# Altium footprint library Inductors SMD.PcbLib: 145 footprints (part 2 of 10)
Each footprint in its own frame and in the unit in brackets; x right, y up, seen from the top. Pads: shape width x height; smd on the part's side, far side on the other; paste and mask are expansions set on the pad; w line width, h text height; cw(c..) or ccw(c..) is an arc to the next point about the centre after c.
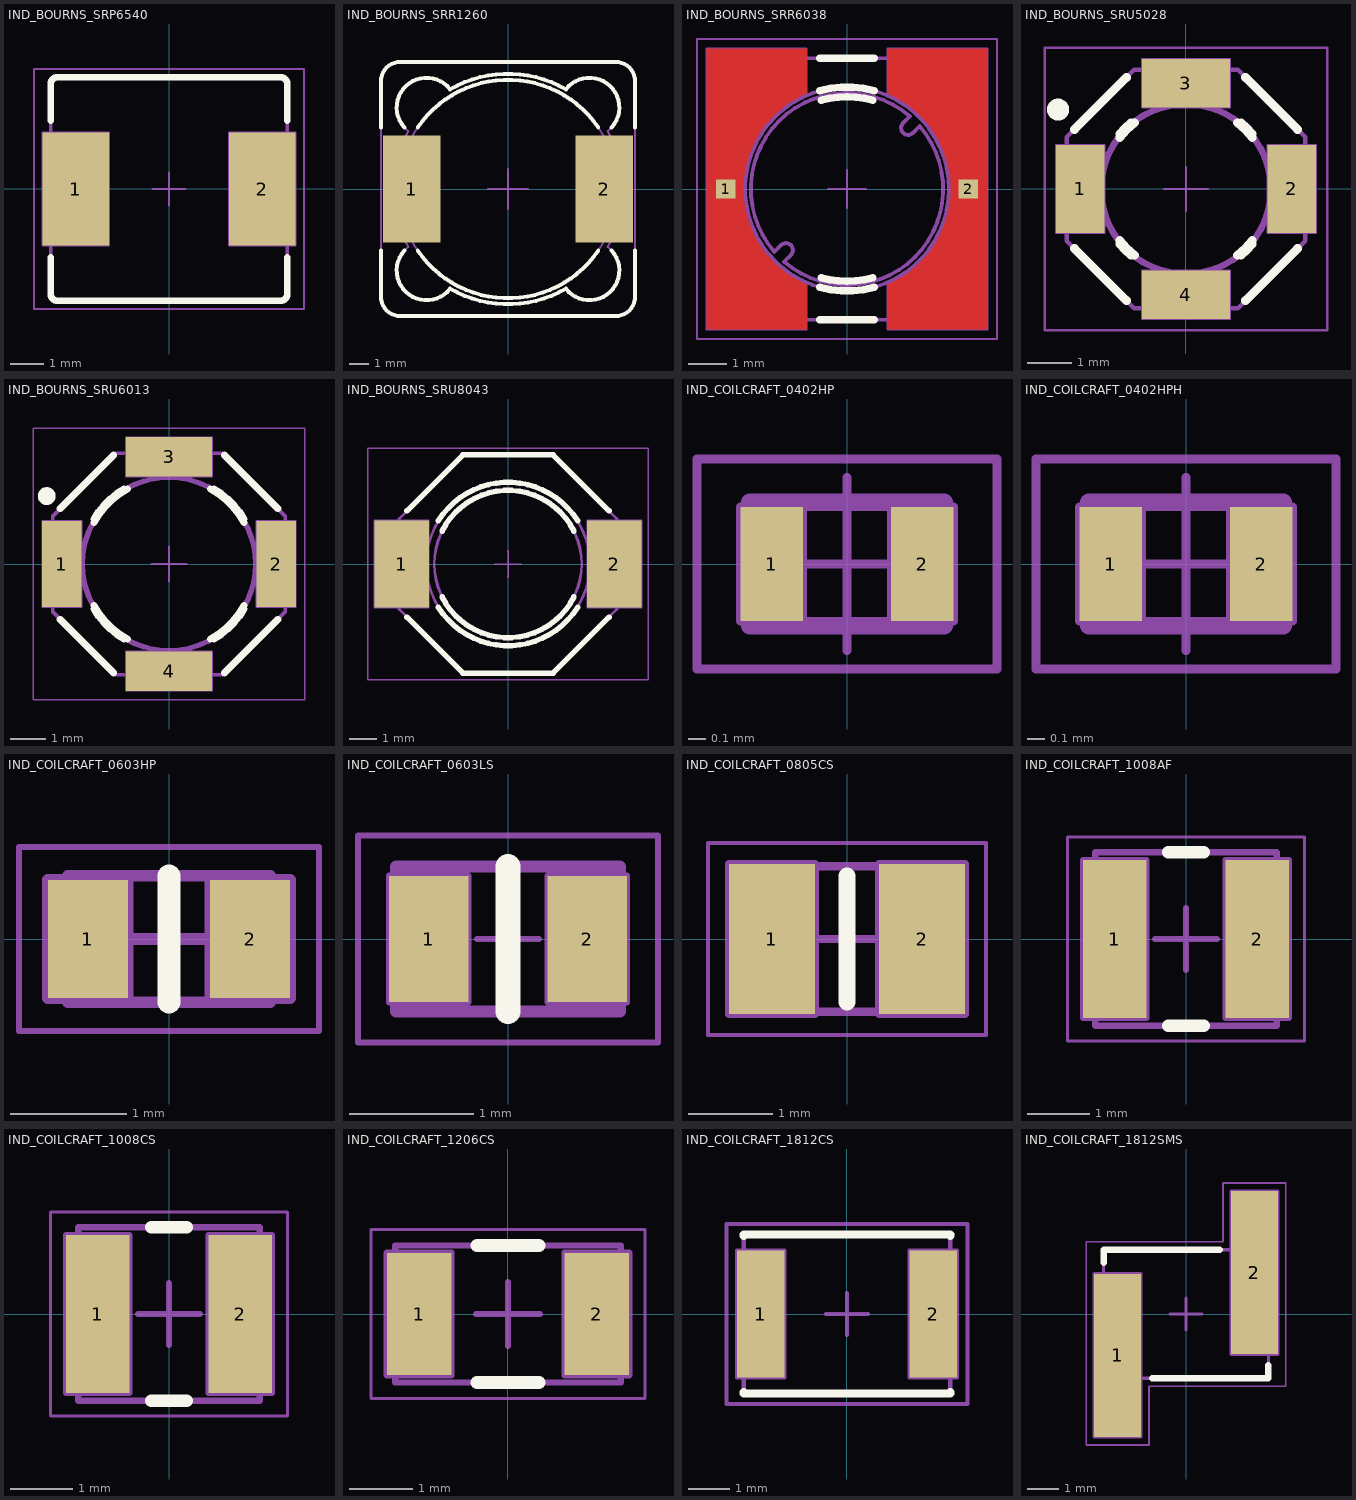
[diagram p1: the footprints below, top view; thin cyan lines are the x and y axes]

## IND_BOURNS_SRP6540 [mm] "SMD Inductor Body Width 7.5mm Body Lenght 6.7mm Height 4mm"
height 4
pads (2):
  rect 2x3.4 smd: 1(-2.8,0) 2(2.8,0)
Top Overlay:
  lines w0.2: -3.55,-2.05 -3.55,-3.15 ccw(c-3.35,-3.15) -3.35,-3.35 3.35,-3.35 ccw(c3.35,-3.15) 3.55,-3.15 3.55,-2.05 ; -3.55,2.05 -3.55,3.15 cw(c-3.35,3.15) -3.35,3.35 3.35,3.35 cw(c3.35,3.15) 3.55,3.15 3.55,2.05
Mechanical 8:
  lines w0.05: -3.3,0 -2.8,0 ; -2.8,-0.5 -2.8,0 ; -2.8,0.5 -2.8,0 ; -2.3,0 -2.8,0 ; -0.5,0 0,0 ; 0,-0.5 0,0 ; 0,0.5 0,0 ; 0.5,0 0,0 ; 2.3,0 2.8,0 ; 2.8,-0.5 2.8,0 ; 2.8,0.5 2.8,0 ; 3.3,0 2.8,0 ; -3.8,-1.7 -1.8,-1.7 -1.8,1.7 -3.8,1.7 -3.8,-1.7 ; 1.8,-1.7 3.8,-1.7 3.8,1.7 1.8,1.7 1.8,-1.7
Mechanical 14:
  lines w0.1: -3.55,-1.65 -3.75,-1.65 -3.75,1.65 -3.55,1.65 ; 3.55,-1.65 3.75,-1.65 3.75,1.65 3.55,1.65 ; -3.55,-3.15 ccw(c-3.35,-3.15) -3.35,-3.35 3.35,-3.35 ccw(c3.35,-3.15) 3.55,-3.15 3.55,3.15 ccw(c3.35,3.15) 3.35,3.35 -3.35,3.35 ccw(c-3.35,3.15) -3.55,3.15 -3.55,-3.15
Mechanical 15:
  lines w0.05: -4.05,-3.6 -4.05,3.6 4.05,3.6 4.05,-3.6 -4.05,-3.6
3D body "IND_BOURNS_SRP6540.stp": height 4, standoff 0, extent -3.75,-3.35 3.75,3.35

## IND_BOURNS_SRR1260 [mm] "SMD Inductor Body Width 12.5mm Body Lenght 12.5mm Height 6.5mm"
height 6.5
pads (2):
  rect 2.9x5.4 smd: 1(-4.85,0) 2(4.85,0)
Top Overlay:
  lines w0.2: -6.4,-3.1 -6.4,-5.4 ccw(c-5.4,-5.4) -5.4,-6.4 5.4,-6.4 ccw(c5.4,-5.4) 6.4,-5.4 6.4,-3.1 ; -6.4,3.1 -6.4,5.4 cw(c-5.4,5.4) -5.4,6.4 5.4,6.4 cw(c5.4,5.4) 6.4,5.4 6.4,3.1 ; -5.218,-3.1 ccw(c-4.101,-4.101) -2.912,-5.016 ccw(c0,0) 2.912,-5.016 ccw(c4.101,-4.101) 5.218,-3.1 ; -5.218,3.1 cw(c-4.101,4.101) -2.912,5.016 cw(c0,0) 2.912,5.016 cw(c4.101,4.101) 5.218,3.1 ; -4.543,-3.1 ccw(c0,0) 4.543,-3.1 ; -4.543,3.1 cw(c0,0) 4.543,3.1
Mechanical 8:
  lines w0.1: -5.85,0 -4.85,0 ; -4.85,-1 -4.85,0 ; -4.85,1 -4.85,0 ; -3.85,0 -4.85,0 ; -1,0 0,0 ; 0,-1 0,0 ; 0,1 0,0 ; 1,0 0,0 ; 3.85,0 4.85,0 ; 4.85,-1 4.85,0 ; 4.85,1 4.85,0 ; 5.85,0 4.85,0
Mechanical 14:
  circle w0.1: c0,0 r5.5
  lines w0.1: -6.4,-5.4 ccw(c-5.4,-5.4) -5.4,-6.4 5.4,-6.4 ccw(c5.4,-5.4) 6.4,-5.4 6.4,5.4 ccw(c5.4,5.4) 5.4,6.4 -5.4,6.4 ccw(c-5.4,5.4) -6.4,5.4 -6.4,-5.4 ; -5.016,-2.912 ccw(c-4.101,-4.101) -2.912,-5.016 ccw(c0,0) 2.912,-5.016 ccw(c4.101,-4.101) 5.016,-2.912 ccw(c0,0) 5.016,2.912 ccw(c4.101,4.101) 2.912,5.016 ccw(c0,0) -2.912,5.016 ccw(c-4.101,4.101) -5.016,2.912 ccw(c0,0) -5.016,-2.912
3D body "IND_BOURNS_SRR1260.stp": height 6.5, standoff 0, extent -6.4,-6.4 6.4,6.4

## IND_BOURNS_SRR6038 [mm] "SMD Inductor Body Width 7mm Body Lenght 7mm Height 4mm"
height 4
pads (2):
  rect 0.5x0.5 smd: 1(-3.15,0) 2(3.15,0)
Top Layer:
  region: 1.05,-3.65 3.65,-3.65 3.65,3.65 1.05,3.65 1.05,2.487 1.229,2.404 1.567,2.199 1.871,1.947 2.135,1.653 2.353,1.324 2.521,0.966 2.635,0.588 2.693,0.197 2.693,-0.197 2.635,-0.588 2.521,-0.966 2.353,-1.324 2.135,-1.653 1.871,-1.947 1.567,-2.199 1.229,-2.404 1.05,-2.487
  region: -3.65,-3.65 -3.65,3.65 -1.05,3.65 -1.05,2.487 -1.229,2.404 -1.567,2.199 -1.871,1.947 -2.135,1.653 -2.353,1.324 -2.521,0.966 -2.635,0.588 -2.693,0.197 -2.693,-0.197 -2.635,-0.588 -2.521,-0.966 -2.353,-1.324 -2.135,-1.653 -1.871,-1.947 -1.567,-2.199 -1.229,-2.404 -1.05,-2.487 -1.05,-3.65
Top Overlay:
  lines w0.2: -0.7,-3.4 0.7,-3.4 ; -0.7,-2.556 ccw(c0,0) 0.7,-2.556 ; -0.7,2.556 cw(c0,0) 0.7,2.556 ; -0.7,3.4 0.7,3.4 ; -0.672,-2.304 ccw(c0,0) 0.672,-2.304 ; -0.672,2.304 cw(c0,0) 0.672,2.304
Mechanical 8:
  lines w0.05: -3.15,-0.5 -3.15,0 ; -3.15,0.5 -3.15,0 ; -2.65,0 -3.15,0 ; -0.5,0 0,0 ; 0,-0.5 0,0 ; 0,0.5 0,0 ; 0.5,0 0,0 ; 2.65,0 3.15,0 ; 3.15,-0.5 3.15,0 ; 3.15,0.5 3.15,0 ; -3.65,-3.65 -1.05,-3.65 -1.05,-2.487 cw(c0,0) -1.05,2.487 -1.05,3.65 -3.65,3.65 -3.65,-3.65 ; 1.05,-3.65 1.05,-2.487 ccw(c0,0) 1.05,2.487 1.05,3.65 3.65,3.65 3.65,-3.65 1.05,-3.65
Mechanical 14:
  circle w0.1: c0,0 r2.65
  lines w0.1: -3.4,-3.35 ccw(c-3.35,-3.35) -3.35,-3.4 3.35,-3.4 ccw(c3.35,-3.35) 3.4,-3.35 3.4,3.35 ccw(c3.35,3.35) 3.35,3.4 -3.35,3.4 ccw(c-3.35,3.35) -3.4,3.35 -3.4,-3.35 ; -1.89,-1.636 cw(c0,0) 1.636,1.89 1.459,1.714 ccw(c1.586,1.586) 1.714,1.459 1.89,1.636 cw(c0,0) -1.636,-1.89 -1.459,-1.714 ccw(c-1.586,-1.586) -1.714,-1.459 -1.89,-1.636
Mechanical 15:
  lines w0.05: -3.9,-3.9 -3.9,3.9 3.9,3.9 3.9,-3.9 -3.9,-3.9
3D body "IND_BOURNS_SRR6038.stp": height 3.8, standoff 0, extent -3.4,-3.4 3.4,3.4

## IND_BOURNS_SRU5028 [mm] "SMD Inductor Body Width 5.4mm Body Lenght 5.4mm Height 3mm"
height 3
pads (4):
  rect 1.1x2 smd: 1(-2.4,0) 2(2.4,0)
  rect 2x1.1 smd: 3(0,2.4) 4(0,-2.4)
Top Overlay:
  circle w0.25: c-2.9,1.8 r0.125
  lines w0.2: -2.527,-1.35 -1.35,-2.527 ; -2.527,1.35 -1.35,2.527 ; -1.5,-1.246 ccw(c0,0) -1.246,-1.5 ; -1.5,-1.166 ccw(c0,0) -1.166,-1.5 ; -1.5,1.166 cw(c0,0) -1.166,1.5 ; -1.5,1.246 cw(c0,0) -1.246,1.5 ; 1.166,-1.5 ccw(c0,0) 1.5,-1.166 ; 1.166,1.5 cw(c0,0) 1.5,1.166 ; 1.246,-1.5 ccw(c0,0) 1.5,-1.246 ; 1.246,1.5 cw(c0,0) 1.5,1.246 ; 1.35,-2.527 2.527,-1.35 ; 1.35,2.527 2.527,1.35
Mechanical 8:
  lines w0.05: -2.9,0 -2.4,0 ; -2.4,-0.5 -2.4,0 ; -2.4,0.5 -2.4,0 ; -1.9,0 -2.4,0 ; -0.5,-2.4 0,-2.4 ; -0.5,0 0,0 ; -0.5,2.4 0,2.4 ; 0,-2.9 0,-2.4 ; 0,-1.9 0,-2.4 ; 0,-0.5 0,0 ; 0,0.5 0,0 ; 0,1.9 0,2.4 ; 0,2.9 0,2.4 ; 0.5,-2.4 0,-2.4 ; 0.5,0 0,0 ; 0.5,2.4 0,2.4 ; 1.9,0 2.4,0 ; 2.4,-0.5 2.4,0 ; 2.4,0.5 2.4,0 ; 2.9,0 2.4,0 ; -2.95,-1 -2.95,1 -1.85,1 -1.85,-1 -2.95,-1 ; -1,-2.95 1,-2.95 1,-1.85 -1,-1.85 -1,-2.95 ; -1,1.85 1,1.85 1,2.95 -1,2.95 -1,1.85 ; 1.85,-1 1.85,1 2.95,1 2.95,-1 1.85,-1
Mechanical 14:
  circle w0.1: c0,0 r1.9
  circle w0.1: c0,0 r1.95
  lines w0.1: -2.7,-1.177 -2.7,1.177 -1.177,2.7 1.177,2.7 2.7,1.177 2.7,-1.177 1.177,-2.7 -1.177,-2.7 -2.7,-1.177
Mechanical 15:
  lines w0.05: -3.2,-3.2 3.2,-3.2 3.2,3.2 -3.2,3.2 -3.2,-3.2
3D body "IND_BOURNS_SRU5028.stp": height 2.8, standoff 0, extent -2.7,-2.7 2.7,2.7

## IND_BOURNS_SRU6013 [mm] "SMD Inductor Body Width 6.5mm Body Lenght 6.5mm Height 1.6mm"
height 1.6
pads (4):
  rect 1.1x2.4 smd: 1(-3,0) 2(3,0)
  rect 2.4x1.1 smd: 3(0,3) 4(0,-3)
Top Overlay:
  circle w0.25: c-3.425,1.9 r0.125
  lines w0.2: -3.046,-1.55 -1.55,-3.046 ; -3.046,1.55 -1.55,3.046 ; -2.1,-1.262 ccw(c0,0) -1.262,-2.1 ; -2.1,-1.162 ccw(c0,0) -1.162,-2.1 ; -2.1,1.162 cw(c0,0) -1.162,2.1 ; -2.1,1.262 cw(c0,0) -1.262,2.1 ; 1.162,-2.1 ccw(c0,0) 2.1,-1.162 ; 1.162,2.1 cw(c0,0) 2.1,1.162 ; 1.262,-2.1 ccw(c0,0) 2.1,-1.262 ; 1.262,2.1 cw(c0,0) 2.1,1.262 ; 1.55,-3.046 3.046,-1.55 ; 1.55,3.046 3.046,1.55
Mechanical 8:
  lines w0.05: -3.5,0 -3,0 ; -3,-0.5 -3,0 ; -3,0.5 -3,0 ; -2.5,0 -3,0 ; -0.5,-3 0,-3 ; -0.5,0 0,0 ; -0.5,3 0,3 ; 0,-3.5 0,-3 ; 0,-2.5 0,-3 ; 0,-0.5 0,0 ; 0,0.5 0,0 ; 0,2.5 0,3 ; 0,3.5 0,3 ; 0.5,-3 0,-3 ; 0.5,0 0,0 ; 0.5,3 0,3 ; 2.5,0 3,0 ; 3,-0.5 3,0 ; 3,0.5 3,0 ; 3.5,0 3,0 ; -3.55,-1.2 -2.45,-1.2 -2.45,1.2 -3.55,1.2 -3.55,-1.2 ; -1.2,-3.55 -1.2,-2.45 1.2,-2.45 1.2,-3.55 -1.2,-3.55 ; -1.2,2.45 1.2,2.45 1.2,3.55 -1.2,3.55 -1.2,2.45 ; 2.45,-1.2 2.45,1.2 3.55,1.2 3.55,-1.2 2.45,-1.2
Mechanical 14:
  circle w0.1: c0,0 r2.4
  circle w0.1: c0,0 r2.45
  lines w0.1: -3.25,-1.346 -1.496,-3.1 1.496,-3.1 3.25,-1.346 3.25,1.346 1.496,3.1 -1.496,3.1 -3.25,1.346 -3.25,-1.346
Mechanical 15:
  lines w0.05: -3.8,-3.8 3.8,-3.8 3.8,3.8 -3.8,3.8 -3.8,-3.8
3D body "IND_BOURNS_SRU6013.stp": height 1.6, standoff 0, extent -3.25,-3.1 3.25,3.1

## IND_BOURNS_SRU8043 [mm] "SMD Inductor Body Width 8.3mm Body Lenght 8.3mm Height 4.6mm"
height 4.6
pads (2):
  rect 2x3.2 smd: 1(-3.9,0) 2(3.9,0)
Top Overlay:
  lines w0.2: -3.707,-1.95 -1.657,-4 1.657,-4 3.707,-1.95 ; -3.707,1.95 -1.657,4 1.657,4 3.707,1.95 ; -2.55,-1.58 ccw(c0,0) 2.55,-1.58 ; -2.55,1.58 cw(c0,0) 2.55,1.58 ; -2.416,-1.206 ccw(c0,0) 2.416,-1.206 ; -2.416,1.206 cw(c0,0) 2.416,1.206
Mechanical 8:
  lines w0.05: -4.4,0 -3.9,0 ; -3.9,-0.5 -3.9,0 ; -3.9,0.5 -3.9,0 ; -3.4,0 -3.9,0 ; -0.5,0 0,0 ; 0,-0.5 0,0 ; 0,0.5 0,0 ; 0.5,0 0,0 ; 3.4,0 3.9,0 ; 3.9,-0.5 3.9,0 ; 3.9,0.5 3.9,0 ; 4.4,0 3.9,0 ; -4.9,-1.6 -4.9,1.6 -2.9,1.6 -2.9,-1.6 -4.9,-1.6 ; 2.9,-1.6 2.9,1.6 4.9,1.6 4.9,-1.6 2.9,-1.6
Mechanical 14:
  circle w0.1: c0,0 r3
  circle w0.1: c0,0 r2.7
  lines w0.1: -4,-1.657 -4,1.657 -1.657,4 1.657,4 4,1.657 4,-1.657 1.657,-4 -1.657,-4 -4,-1.657
Mechanical 15:
  lines w0.05: -5.15,-4.25 -5.15,4.25 5.15,4.25 5.15,-4.25 -5.15,-4.25
3D body "IND_BOURNS_SRU8043.stp": height 4.3, standoff 0, extent -4,-4 4,4

## IND_COILCRAFT_0402HP [mm] "Chip Inductor, Body Width 0.71mm Body Lenght 1.09mm Height 0.61mm"
height 0.61
pads (2):
  rect 0.36x0.66 smd: 1(-0.435,0) 2(0.435,0)
Mechanical 8:
  lines w0.05: -0.5,0 0,0 ; 0,-0.5 0,0 ; 0,0.5 0,0 ; 0.255,0 0,0 ; 0.5,0 0,0 ; -0.615,0.33 -0.435,0 -0.255,0.33 ; -0.615,0.33 -0.255,0.33 ; -0.615,0.33 -0.615,-0.33 -0.255,-0.33 -0.255,0.33 ; 0.255,0.33 0.435,0 0.615,0.33 ; 0.255,0.33 0.255,-0.33 0.615,-0.33 0.615,0.33 ; 0.255,0.33 0.615,0.33
Mechanical 14:
  lines w0.1: -0.56,-0.356 0.56,-0.356 0.56,0.356 -0.56,0.356 -0.56,-0.356
Mechanical 15:
  lines w0.05: -0.865,-0.606 -0.865,0.606 0.865,0.606 0.865,-0.606 -0.865,-0.606
3D body "IND_COILCRAFT_0402HP.stp": height 0.61, standoff 0, extent -0.548,-0.355 0.548,0.356

## IND_COILCRAFT_0402HPH [mm] "Chip Inductor, Body Width 0.71mm Body Lenght 1.12mm Height 0.66mm"
height 0.66
pads (2):
  rect 0.36x0.66 smd: 1(-0.435,0) 2(0.435,0)
Mechanical 8:
  lines w0.05: -0.5,0 0,0 ; 0,-0.5 0,0 ; 0,0.5 0,0 ; 0.255,0 0,0 ; 0.5,0 0,0 ; -0.615,0.33 -0.615,-0.33 -0.255,-0.33 -0.255,0.33 ; -0.615,0.33 -0.255,0.33 ; -0.615,0.33 -0.435,0 -0.255,0.33 ; 0.255,0.33 0.615,0.33 ; 0.255,0.33 0.255,-0.33 0.615,-0.33 0.615,0.33 ; 0.255,0.33 0.435,0 0.615,0.33
Mechanical 14:
  lines w0.1: -0.56,-0.356 -0.56,0.356 0.56,0.356 0.56,-0.356 -0.56,-0.356
Mechanical 15:
  lines w0.05: -0.865,-0.606 0.865,-0.606 0.865,0.606 -0.865,0.606 -0.865,-0.606
3D body "IND_COILCRAFT_0402HPH.stp": height 0.66, standoff 0, extent -0.56,-0.355 0.56,0.356

## IND_COILCRAFT_0603HP [mm] "Chip Inductor, Body Width 1.09mm Body Lenght 1.75mm Height 0.94mm"
height 0.94
pads (2):
  rect 0.69x1.02 smd: 1(-0.7,0) 2(0.7,0)
Top Overlay:
  lines w0.2: 0,-0.545 0,0.545
Mechanical 8:
  lines w0.1: -0.5,0 0,0 ; 0,-0.5 0,0 ; 0,0.5 0,0 ; 0.5,0 0,0 ; -1.045,-0.51 -1.045,0.51 ; -1.045,-0.51 -0.355,-0.51 -0.355,0.51 -1.045,0.51 ; -1.045,-0.51 -0.7,0 -1.045,0.51 ; 1.045,-0.51 0.355,-0.51 0.355,0.51 1.045,0.51 ; 1.045,-0.51 1.045,0.51 ; 1.045,-0.51 0.7,0 1.045,0.51
Mechanical 14:
  lines w0.1: -0.875,-0.545 0.875,-0.545 0.875,0.545 -0.875,0.545 -0.875,-0.545
Mechanical 15:
  lines w0.05: -1.295,-0.795 1.295,-0.795 1.295,0.795 -1.295,0.795 -1.295,-0.795
3D body "IND_COILCRAFT_0603HP.stp": height 0.93, standoff -0.01, extent -0.875,-0.545 0.875,0.545

## IND_COILCRAFT_0603LS [mm] "SMD Inductor  Body Width 1.27mm Body Lenght 1.8mm Height 1.12mm, 0603LS Series"
height 1.12
pads (2):
  rect 0.64x1.02 smd: 1(-0.64,0) 2(0.64,0)
Top Overlay:
  lines w0.2: 0,-0.584 0,0.584
Mechanical 8:
  lines w0.05: -0.64,-0.51 -0.64,0 -0.32,0 ; -0.25,0 0,0 ; 0,-0.25 0,0 ; 0,0.25 0,0 ; 0.25,0 0,0 ; 0.64,-0.51 0.64,0 0.96,0 ; -0.96,-0.51 -0.32,-0.51 -0.32,0.51 -0.96,0.51 -0.96,-0.51 ; 0.32,-0.51 0.96,-0.51 0.96,0.51 0.32,0.51 0.32,-0.51
Mechanical 14:
  circle w0.1: c-0.636,0 r0.07
  lines w0.1: -0.901,-0.584 -0.901,0.584 0.901,0.584 0.901,-0.584 -0.901,-0.584
Mechanical 15:
  lines w0.05: -1.21,-0.834 1.21,-0.834 1.21,0.834 -1.21,0.834 -1.21,-0.834
3D body "IND_15UH_5%_COILCRAFT_0603LS.stp": height 1.12, standoff 0, extent -0.901,-0.584 0.901,0.585

## IND_COILCRAFT_0805CS [mm] "SMD Inductor  Body Width 1.73mm Body Lenght 2.29mm Height 1.52mm, 0805CS Series"
height 1.52
pads (2):
  rect 1.02x1.78 smd: 1(-0.89,0) 2(0.89,0)
Top Overlay:
  lines w0.2: 0,-0.75 0,0.75
Mechanical 8:
  lines w0.1: -1.39,0 -0.89,0 ; -0.89,-0.5 -0.89,0 ; -0.89,0.5 -0.89,0 ; -0.5,0 0,0 ; -0.39,0 -0.89,0 ; 0,-0.5 0,0 ; 0,0.5 0,0 ; 0.39,0 0.89,0 ; 0.5,0 0,0 ; 0.89,-0.5 0.89,0 ; 0.89,0.5 0.89,0 ; 1.39,0 0.89,0 ; -1.4,-0.89 -1.4,0.89 -0.38,0.89 -0.38,-0.89 -1.4,-0.89 ; 0.38,-0.89 0.38,0.89 1.4,0.89 1.4,-0.89 0.38,-0.89
Mechanical 14:
  lines w0.1: -1.145,-0.863 1.145,-0.863 1.145,0.863 -1.145,0.863 -1.145,-0.863
Mechanical 15:
  lines w0.05: -1.65,-1.14 -1.65,1.14 1.65,1.14 1.65,-1.14 -1.65,-1.14
3D body "IND_COILCRAFT_0805CS.stp": height 1.52, standoff 0, extent -1.144,-0.862 1.145,0.863

## IND_COILCRAFT_1008AF [mm] "SMD Inductor Body Width 2.79m Body Lenght 2.92mm Height 1.91mm"
height 1.91
pads (2):
  rect 1.02x2.54 smd: 1(-1.145,0) 2(1.145,0)
Top Overlay:
  lines w0.2: -0.285,-1.395 0.285,-1.395 ; -0.285,1.395 0.285,1.395
Mechanical 8:
  lines w0.1: -1.645,0 -1.145,0 ; -1.145,-0.5 -1.145,0 ; -1.145,0.5 -1.145,0 ; -0.645,0 -1.145,0 ; -0.5,0 0,0 ; 0,-0.5 0,0 ; 0,0.5 0,0 ; 0.5,0 0,0 ; 0.645,0 1.145,0 ; 1.145,-0.5 1.145,0 ; 1.145,0.5 1.145,0 ; 1.645,0 1.145,0 ; -1.655,-1.27 -0.635,-1.27 -0.635,1.27 -1.655,1.27 -1.655,-1.27 ; 0.635,-1.27 1.655,-1.27 1.655,1.27 0.635,1.27 0.635,-1.27
Mechanical 14:
  lines w0.1: -1.46,-1.395 -1.46,1.395 1.46,1.395 1.46,-1.395 -1.46,-1.395
Mechanical 15:
  lines w0.05: -1.905,-1.645 1.905,-1.645 1.905,1.645 -1.905,1.645 -1.905,-1.645
3D body "IND_COILCRAFT_1008AF.stp": height 1.91, standoff 0, extent -1.462,-1.39 1.458,1.4

## IND_COILCRAFT_1008CS [mm] "SMD Inductor Body Width 2.79m Body Lenght 2.92mm Height 2.03mm"
height 2.03
pads (2):
  rect 1.02x2.54 smd: 1(-1.145,0) 2(1.145,0)
Top Overlay:
  lines w0.2: -0.285,-1.395 0.285,-1.395 ; -0.285,1.395 0.285,1.395
Mechanical 8:
  lines w0.1: -1.645,0 -1.145,0 ; -1.145,-0.5 -1.145,0 ; -1.145,0.5 -1.145,0 ; -0.645,0 -1.145,0 ; -0.5,0 0,0 ; 0,-0.5 0,0 ; 0,0.5 0,0 ; 0.5,0 0,0 ; 0.645,0 1.145,0 ; 1.145,-0.5 1.145,0 ; 1.145,0.5 1.145,0 ; 1.645,0 1.145,0 ; -1.655,-1.27 -1.655,1.27 -0.635,1.27 -0.635,-1.27 -1.655,-1.27 ; 0.635,-1.27 0.635,1.27 1.655,1.27 1.655,-1.27 0.635,-1.27
Mechanical 14:
  lines w0.1: -1.46,-1.395 1.46,-1.395 1.46,1.395 -1.46,1.395 -1.46,-1.395
Mechanical 15:
  lines w0.05: -1.905,-1.645 -1.905,1.645 1.905,1.645 1.905,-1.645 -1.905,-1.645
3D body "IND_COILCRAFT_1008CS.stp": height 2.18, standoff 0, extent -1.46,-1.395 1.46,1.395

## IND_COILCRAFT_1206CS [mm] "SMD Inductor  Body Width 2.16mm Body Lenght 3.56mm Height 1.52mm, 1206CS Series"
height 1.52
pads (2):
  rect 1.02x1.93 smd: 1(-1.4,0) 2(1.4,0)
Top Overlay:
  lines w0.2: -0.49,-1.08 0.49,-1.08 ; -0.49,1.08 0.49,1.08
Mechanical 8:
  lines w0.1: -1.9,0 -1.4,0 ; -1.4,-0.5 -1.4,0 ; -1.4,0.5 -1.4,0 ; -0.9,0 -1.4,0 ; -0.5,0 0,0 ; 0,-0.5 0,0 ; 0,0.5 0,0 ; 0.5,0 0,0 ; 0.9,0 1.4,0 ; 1.4,-0.5 1.4,0 ; 1.4,0.5 1.4,0 ; 1.9,0 1.4,0 ; -1.91,-0.965 -1.91,0.965 -0.89,0.965 -0.89,-0.965 -1.91,-0.965 ; 0.89,-0.965 0.89,0.965 1.91,0.965 1.91,-0.965 0.89,-0.965
Mechanical 14:
  lines w0.1: -1.78,-1.08 -1.78,1.08 1.78,1.08 1.78,-1.08 -1.78,-1.08
Mechanical 15:
  lines w0.05: -2.16,-1.33 -2.16,1.33 2.16,1.33 2.16,-1.33 -2.16,-1.33
3D body "IND_COILCRAFT_1206CS.stp": height 1.51, standoff 0, extent -1.78,-1.08 1.78,1.08

## IND_COILCRAFT_1812CS [mm] "SMD Inductor  Body Width 4.95mm Body Lenght 3.81mm Height 3.43mm, 1812CS Series"
height 1.52
pads (2):
  rect 1.14x3.05 smd: 1(-2.07,0) 2(2.07,0)
Top Overlay:
  lines w0.2: -2.475,-1.875 -2.475,-1.905 2.475,-1.905 2.475,-1.875 ; -2.475,1.875 -2.475,1.905 2.475,1.905 2.475,1.875
Mechanical 8:
  lines w0.1: -2.57,0 -2.07,0 ; -2.07,-0.5 -2.07,0 ; -2.07,0.5 -2.07,0 ; -1.57,0 -2.07,0 ; -0.5,0 0,0 ; 0,-0.5 0,0 ; 0,0.5 0,0 ; 0.5,0 0,0 ; 1.57,0 2.07,0 ; 2.07,-0.5 2.07,0 ; 2.07,0.5 2.07,0 ; 2.57,0 2.07,0 ; -2.64,-1.525 -2.64,1.525 -1.5,1.525 -1.5,-1.525 -2.64,-1.525 ; 1.5,-1.525 1.5,1.525 2.64,1.525 2.64,-1.525 1.5,-1.525
Mechanical 14:
  lines w0.1: -2.475,-1.905 2.475,-1.905 2.475,1.905 -2.475,1.905 -2.475,-1.905
Mechanical 15:
  lines w0.1: -2.89,-2.155 -2.89,2.155 2.89,2.155 2.89,-2.155 -2.89,-2.155
3D body "IND_COILCRAFT_1812CS.stp": height 3.43, standoff 0, extent -2.475,-1.905 2.475,1.905

## IND_COILCRAFT_1812SMS [mm] "SMD Midi Spring Air Core Inductor Body Width 3.56mm Body Lenght 4.32mm Height 4.2mm"
height 42
pads (2):
  rect 1.48x5.16 smd: 1(-2.16,-1.31) 2(2.16,1.31)
Top Overlay:
  lines w0.2: -2.602,1.62 -2.602,2.032 1.07,2.032 ; -1.07,-2.032 2.602,-2.032 2.602,-1.62
Mechanical 8:
  lines w0.1: -2.66,-1.31 -2.16,-1.31 ; -2.16,-1.81 -2.16,-1.31 ; -2.16,-0.81 -2.16,-1.31 ; -1.66,-1.31 -2.16,-1.31 ; -0.5,0 0,0 ; 0,-0.5 0,0 ; 0,0.5 0,0 ; 0.5,0 0,0 ; 1.66,1.31 2.16,1.31 ; 2.16,0.81 2.16,1.31 ; 2.16,1.81 2.16,1.31 ; 2.66,1.31 2.16,1.31 ; -2.9,-3.89 -2.9,1.27 -1.42,1.27 -1.42,-3.89 -2.9,-3.89 ; 1.42,-1.27 1.42,3.89 2.9,3.89 2.9,-1.27 1.42,-1.27
Mechanical 14:
  lines w0.1: -2.475,-2.032 -2.475,-3.175 -1.975,-3.175 -1.975,-2.032 ; 1.975,2.032 1.975,3.175 2.475,3.175 2.475,2.032 ; -2.602,-2.032 -2.602,2.032 2.602,2.032 2.602,-2.032 -2.602,-2.032
Mechanical 15:
  lines w0.05: -3.15,-4.14 -3.15,2.282 1.17,2.282 1.17,4.14 3.15,4.14 3.15,-2.282 -1.17,-2.282 -1.17,-4.14 -3.15,-4.14
3D body "IND_COILCRAFT_1812SMS_Part2.stp": height 4.2, standoff 2.2, extent -2.602,-2.032 2.602,2.032
3D body "IND_COILCRAFT_1812SMS_Part1.stp": height 3.95, standoff 0, extent -2.475,-3.175 2.475,3.175